# Altium footprint library TG-Lib.PcbLib: 25 footprints (part 2 of 2)
Each footprint in its own frame and in the unit in brackets; x right, y up, seen from the top. Pads: shape width x height; smd on the part's side, far side on the other; paste and mask are expansions set on the pad; w line width, h text height; cw(c..) or ccw(c..) is an arc to the next point about the centre after c.
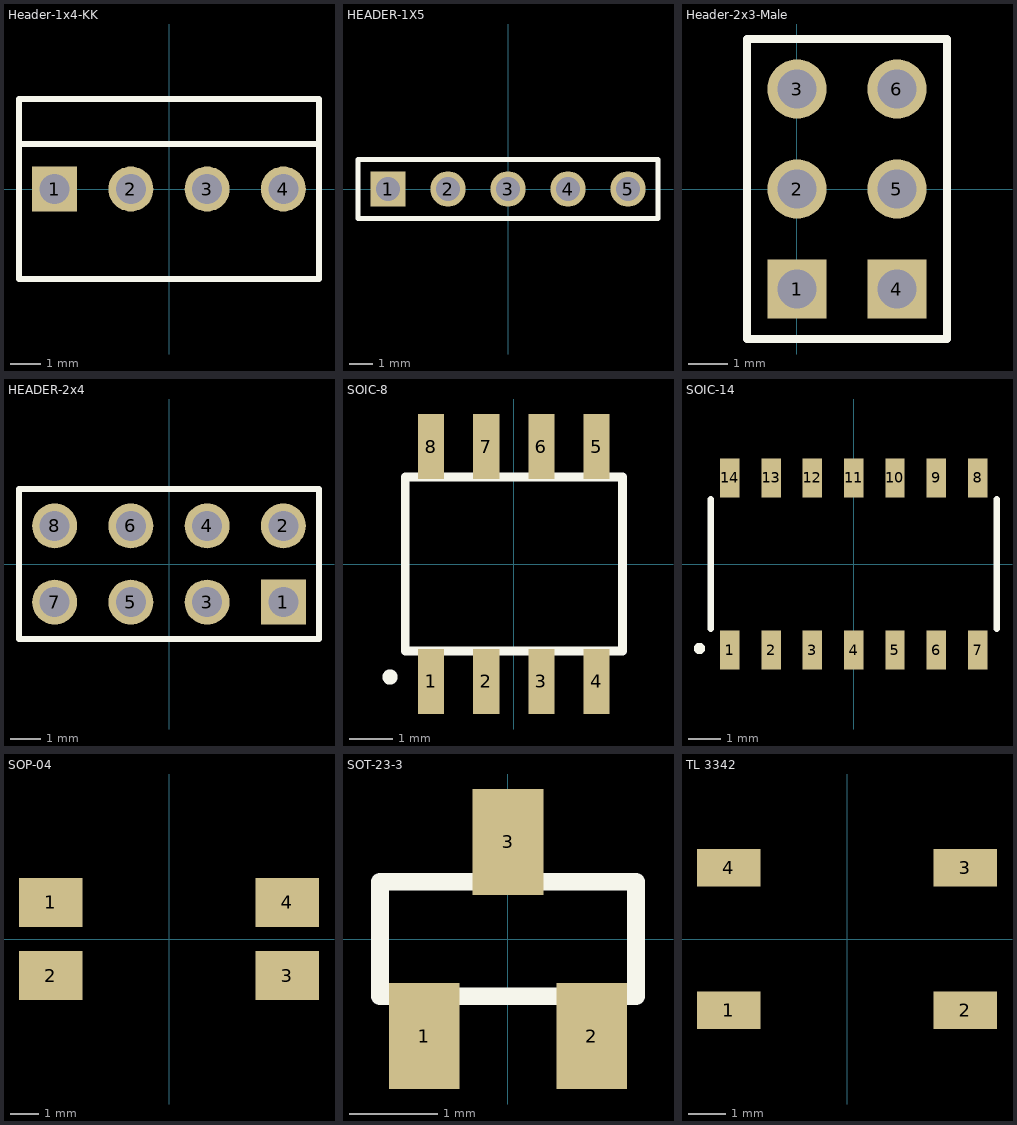
[diagram p1: the footprints below, top view; thin cyan lines are the x and y axes]

## Header-1x4-KK [mm]
pads (4):
  rect 1.5x1.5 hole 1: 1(-3.81,0)
  round 1.5 hole 1: 2(-1.27,0) 3(1.27,0) 4(3.81,0)
Top Overlay:
  lines w0.2: -5,1.5 5,1.5 ; -5,-3 -5,3 5,3 5,-3 -5,-3
3D body: height 11.18, standoff -3.13, extent -5.08,-3.25 5.08,2.55

## HEADER-1X5 [mm]
pads (5):
  rect 1.5x1.5 hole 1: 1(-5.08,0)
  round 1.5 hole 1: 2(-2.54,0) 3(0,0) 4(2.54,0) 5(5.08,0)
Top Overlay:
  lines w0.2: -6.35,-1.25 -6.35,1.25 6.35,1.25 6.35,-1.25 -6.35,-1.25
3D body: height 8.9, standoff -3.04, extent -6.35,-1.25 6.35,1.29

## Header-2x3-Male [mm]
pads (6):
  rect 1.5x1.5 hole 1: 1(0,-2.54) 4(2.54,-2.54)
  round 1.5 hole 1: 2(0,0) 3(0,2.54) 5(2.54,0) 6(2.54,2.54)
Top Overlay:
  lines w0.2: -1.27,-3.81 -1.27,3.81 3.81,3.81 3.81,-3.81 -1.27,-3.81
3D body: height 8.61, standoff -2.99, extent -1.27,-3.81 3.81,3.81

## HEADER-2x4 [mm]
pads (8):
  rect 1.5x1.5 hole 1: 1(3.81,-1.27)
  round 1.5 hole 1: 2(3.81,1.27) 3(1.27,-1.27) 4(1.27,1.27) 5(-1.27,-1.27) 6(-1.27,1.27) 7(-3.81,-1.27) 8(-3.81,1.27)
Top Overlay:
  lines w0.2: -5,-2.5 -5,2.5 5,2.5 5,-2.5 -5,-2.5
3D body: height 8.9, standoff -3.04, extent -5.08,-2.54 5.08,2.54

## SOIC-8 [mm]
pads (8):
  rect 0.6x1.5 smd: 1(-1.905,-2.7) 2(-0.635,-2.7) 3(0.635,-2.7) 4(1.905,-2.7) 5(1.905,2.7) 6(0.635,2.7) 7(-0.635,2.7) 8(-1.905,2.7)
Top Overlay:
  circle w0.2: c-2.85,-2.6 r0.075
  lines w0.2: -2.5,-2 -2.5,2 2.5,2 2.5,-2 -2.5,-2
3D body: height 1.75, standoff 0, extent -2.425,-2.95 2.475,3.05

## SOIC-14 [mm]
pads (14):
  rect 0.6x1.2 smd: 1(-3.81,-2.65) 2(-2.54,-2.65) 3(-1.27,-2.65) 4(0,-2.65) 5(1.27,-2.65) 6(2.54,-2.65) 7(3.81,-2.65) 8(3.81,2.65) 9(2.54,2.65) 10(1.27,2.65) 11(0,2.65) 12(-1.27,2.65) 13(-2.54,2.65) 14(-3.81,2.65)
Top Overlay:
  circle w0.2: c-4.75,-2.6 r0.075
  lines w0.2: -4.4,-2 -4.4,2 ; 4.4,-2 4.4,2
3D body: height 1.46, standoff -0.14, extent -4.318,-3.022 4.318,3.023

## SOP-04 [mm]
pads (4):
  rect 2.2x1.7 smd: 1(-4.1,1.27) 2(-4.1,-1.27) 3(4.1,-1.27) 4(4.1,1.27)
3D body: height 3.86, standoff 0.01, extent -5,-2.29 5,2.29

## SOT-23-3 [mm]
pads (3):
  rect 0.8x1.2 smd: 1(-0.95,-1.1) 2(0.95,-1.1) 3(0,1.1)
Top Overlay:
  lines w0.2: -1.45,-0.65 1.45,-0.65 1.45,0.65 -1.45,0.65 -1.45,-0.65
Mechanical 2:
  lines w0.001: -1.5,-0.7 1.5,-0.7 1.5,0.7 -1.5,0.7 -1.5,-0.7
3D body: height 1.02, standoff -0.09, extent -1.45,-1.2 1.45,1.2

## TL 3342 [mm] "Tactile Switch SMT"
pads (4):
  rect 1.7x1 smd: 1(-3.15,-1.9) 2(3.15,-1.9) 3(3.15,1.9) 4(-3.15,1.9)
3D body: height 1.46, standoff -0.04, extent -3.3,-2.5 3.3,2.5